# Altium footprint library DEMO板PCB封装.PcbLib: 34 footprints (part 2 of 3)
Each footprint in its own frame and in the unit in brackets; x right, y up, seen from the top. Pads: shape width x height; smd on the part's side, far side on the other; paste and mask are expansions set on the pad; w line width, h text height; cw(c..) or ccw(c..) is an arc to the next point about the centre after c.
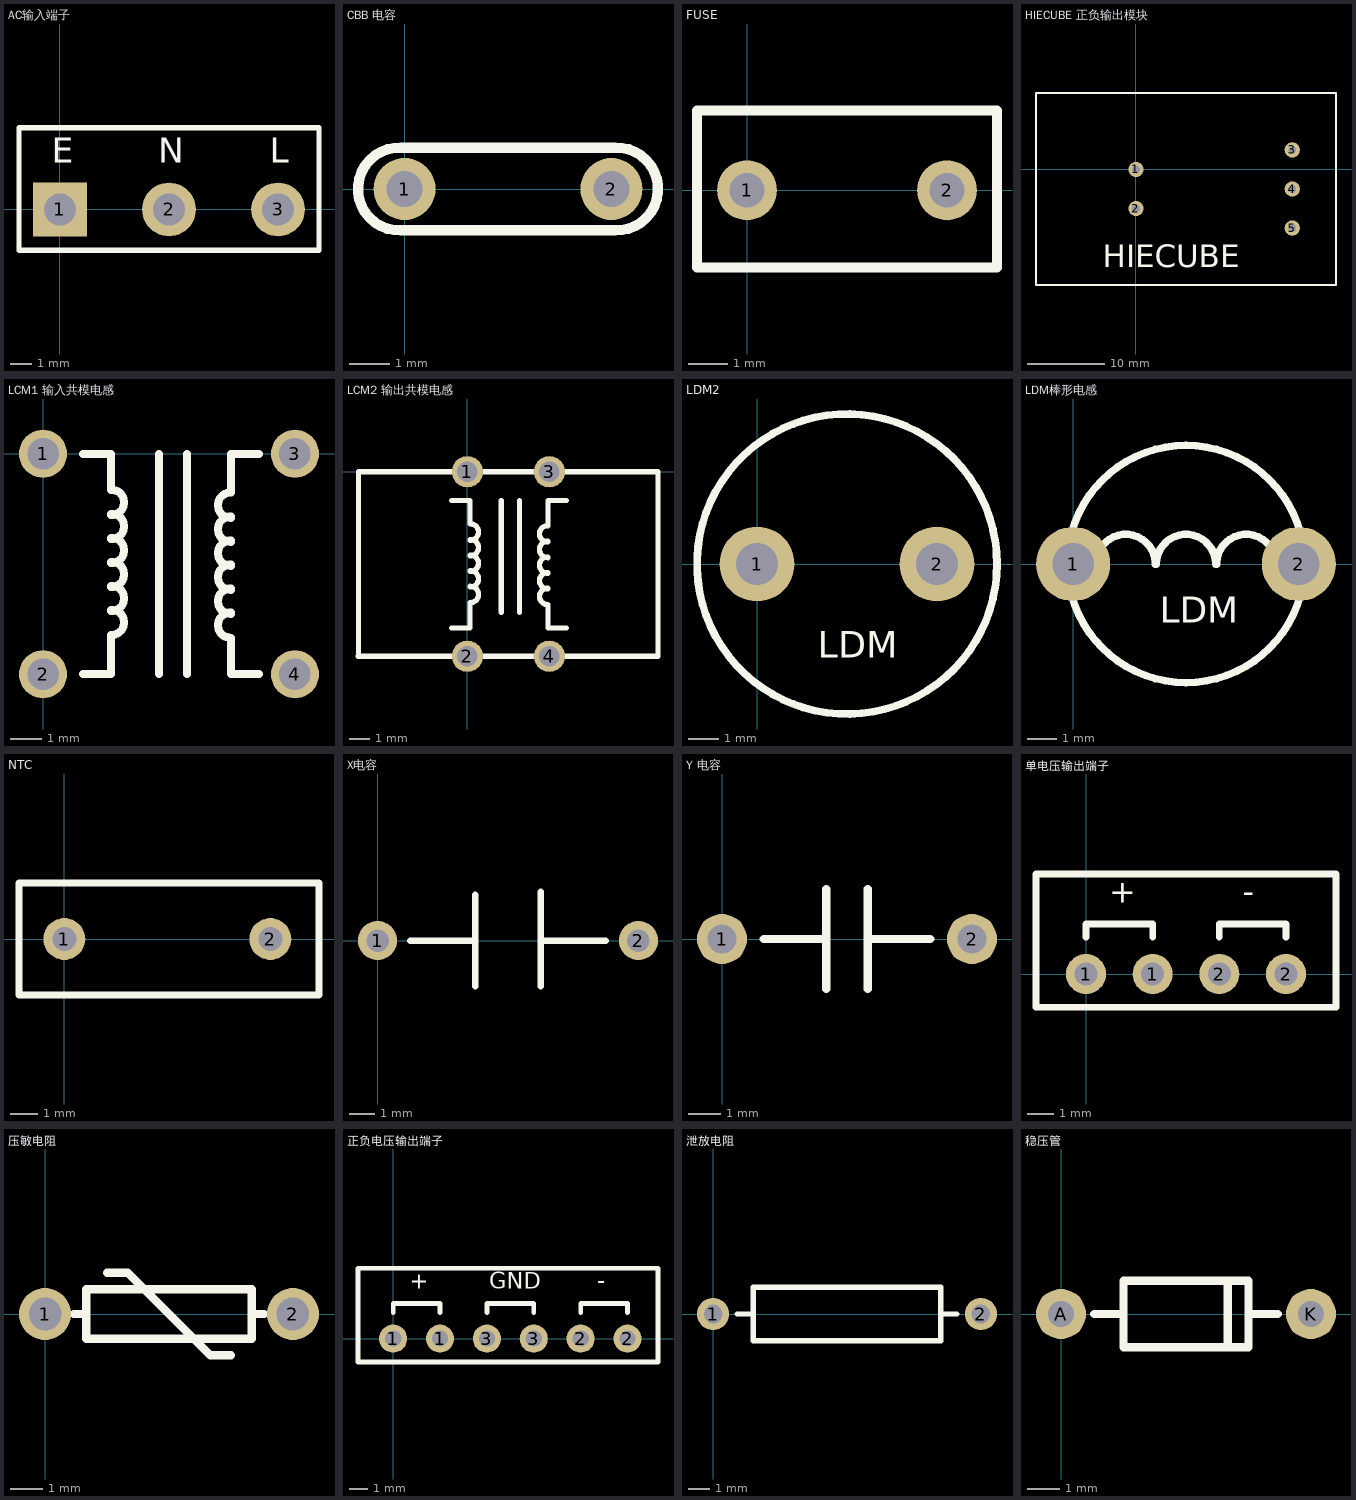
[diagram p1: the footprints below, top view; thin cyan lines are the x and y axes]

## AC输入端子 [mm]
pads (3):
  rect 2.5x2.5 hole 1.5: 1(0,0)
  round 2.5 hole 1.5: 2(5.08,0) 3(10.16,0)
Top Overlay:
  lines w0.254: -1.905,-1.905 12.065,-1.905 12.065,3.81 -1.905,3.81 -1.905,-1.905
  text "E" at -0.381,1.778 h2
  text "L" at 9.779,1.778 h2
  text "N" at 4.572,1.778 h2

## CBB 电容 [mil]
pads (2):
  round 60 hole 34.65: 1(0,0) 2(200,0)
Top Overlay:
  lines w10: -3.14,-40 203.04,-40 ; -3.14,-39.96 cw(c-5,0) -3.04,39.95 ; -3.04,40 203.14,40 ; 203.04,-39.95 ccw(c205,0) 203.14,39.96

## FUSE [mil]
pads (2):
  round 60 hole 34.65: 1(0,0) 2(200,0)
Top Overlay:
  lines w10: -50,-77.48 250,-77.48 250,80 -50,80 -50,-77.48

## HIECUBE 正负输出模块 [mm]
pads (5):
  round 2 hole 1: 1(0,0) 2(0,-5.08) 3(20.32,2.54) 4(20.32,-2.54) 5(20.32,-7.62)
Top Overlay:
  lines w0.254: -13,-15.04 26,-15.04 26,9.96 -13,9.96 -13,-15.04
  text "HIECUBE" at -4.318,-13.716 h5

## LCM1 输入共模电感 [mm]
pads (4):
  round 1.524 hole 1: 1(0,0) 2(0,-7) 3(8,0) 4(8,-7)
Top Overlay:
  lines w0.254: 1.27,-6.985 2.159,-6.985 2.159,-5.842 ; 1.27,0 2.159,0 2.159,-1.143 cw(c2.176,-1.543) 2.157,-1.942 ; 2.157,-5.752 ccw(c2.176,-5.353) 2.159,-4.953 ; 2.157,-4.99 ccw(c2.176,-4.591) 2.159,-4.191 ; 2.157,-4.228 ccw(c2.176,-3.829) 2.159,-3.429 ; 2.157,-3.466 ccw(c2.176,-3.067) 2.159,-2.667 ; 2.157,-2.704 ccw(c2.176,-2.305) 2.159,-1.905 ; 3.683,-6.985 3.683,0 ; 4.572,-6.985 4.572,0 ; 5.969,-5.08 cw(c5.952,-4.68) 5.971,-4.281 ; 5.969,-4.318 cw(c5.952,-3.918) 5.971,-3.519 ; 5.969,-3.556 cw(c5.952,-3.156) 5.971,-2.757 ; 5.969,-2.794 cw(c5.952,-2.394) 5.971,-1.995 ; 5.969,-2.032 cw(c5.952,-1.632) 5.971,-1.233 ; 5.969,-1.143 5.969,0 6.858,0 ; 5.971,-5.043 ccw(c5.952,-5.442) 5.969,-5.842 5.969,-6.985 6.858,-6.985

## LCM2 输出共模电感 [mm]
pads (4):
  round 1.524 hole 1: 1(0,0) 2(0,-9) 3(4,0) 4(4,-9)
Top Overlay:
  lines w0.254: -5.334,-9 9.3,-9 9.3,0 -5.3,0 ; -5.316,-9 -5.316,-0.127 ; -0.762,-7.62 0.127,-7.62 0.127,-6.477 ; -0.762,-1.397 0.127,-1.397 0.127,-2.54 cw(c0.144,-2.94) 0.125,-3.339 ; 0.125,-6.387 ccw(c0.144,-5.988) 0.127,-5.588 ; 0.125,-5.625 ccw(c0.144,-5.226) 0.127,-4.826 ; 0.125,-4.863 ccw(c0.144,-4.464) 0.127,-4.064 ; 0.125,-4.101 ccw(c0.144,-3.702) 0.127,-3.302 ; 1.651,-6.858 1.651,-1.397 ; 2.54,-6.858 2.54,-1.397 ; 3.937,-5.715 cw(c3.92,-5.315) 3.939,-4.916 ; 3.937,-4.953 cw(c3.92,-4.553) 3.939,-4.154 ; 3.937,-4.191 cw(c3.92,-3.791) 3.939,-3.392 ; 3.937,-3.429 cw(c3.92,-3.029) 3.939,-2.63 ; 3.937,-2.54 3.937,-1.397 4.826,-1.397 ; 3.939,-5.678 ccw(c3.92,-6.077) 3.937,-6.477 3.937,-7.62 4.826,-7.62

## LDM2 [mm]
pads (2):
  round 2.5 hole 1.4: 1(0,0) 2(6,0)
Top Overlay:
  circle w0.254: c3,0 r5
  text "LDM" at 2.032,-3.429 h1.52

## LDM棒形电感 [mm]
pads (2):
  round 2.5 hole 1.4: 1(0,0) 2(7.62,0)
Top Overlay:
  circle w0.254: c3.81,0 r4
  lines w0.254: 0.778,0 cw(c1.778,0) 2.778,0 ; 2.81,0 cw(c3.81,0) 4.81,0 ; 4.842,0 cw(c5.842,0) 6.842,0
  text "LDM" at 2.921,-2.286 h1.52

## NTC [mil]
pads (2):
  round 60 hole 34.65: 1(0,0) 2(295.28,0)
Top Overlay:
  lines w10: -65,-80 -65,80 365,80 365,-80 -65,-80

## X电容 [mil]
pads (2):
  round 60 hole 34.65: 1(0,0) 2(400,0)
Top Overlay:
  lines w10: 50,0 150,0 ; 150,-70 150,70 ; 250,-70 250,75 ; 250,0 350,0

## Y 电容 [mil]
pads (2):
  round 60 hole 34.65: 1(0,0) 2(300,0)
Top Overlay:
  lines w10: 50,0 125,0 ; 125,-60 125,60 ; 175,-60 175,60 ; 175,0 250,0

## 单电压输出端子 [mil]
pads (4):
  round 60 hole 34.65: 1(0,0) 1(100,0) 2(200,0) 2(300,0)
Top Overlay:
  lines w10: 0,55 0,75 100,75 100,55 ; 200,55 200,75 300,75 300,55 ; -75,-50 -75,150 375,150 375,-50 -75,-50
  text "+" at 35,95 h60
  text "-" at 235,95 h60

## 压敏电阻 [mm]
pads (2):
  round 1.6 hole 1: 1(0,0) 2(7.62,0)
Top Overlay:
  lines w0.254: 0.889,0 1.27,0 ; 1.905,1.27 2.54,1.27 5.08,-1.27 5.715,-1.27 ; 6.35,0 6.731,0 ; 1.27,-0.762 6.35,-0.762 6.35,0.762 1.27,0.762 1.27,-0.762

## 正负电压输出端子 [mil]
pads (6):
  round 60 hole 34.65: 1(0,0) 1(100,0) 2(400,0) 2(500,0) 3(200,0) 3(300,0)
Top Overlay:
  lines w10: 0,55 0,75 100,75 100,55 ; 200,55 200,75 300,75 300,55 ; 400,55 400,75 500,75 500,55 ; -75,-50 565,-50 565,150 -75,150 -75,-50
  text "GND" at 205,95 h60
  text "-" at 435,95 h60
  text "+" at 35,95 h60

## 泄放电阻 [mil]
pads (2):
  round 60 hole 34.65: 1(0,0) 2(500,0)
Top Overlay:
  lines w10: 45,0 75,0 ; 425,0 455,0 ; 75,-50 75,50 425,50 425,-50 75,-50

## 稳压管 [mil]
pads (2):
  round 60 hole 31.5: A(0,0) K(300,0)
Top Overlay:
  lines w10: 40,0 75,0 ; 200,-40 200,40 ; 225,0 260,0 ; 75,-40 225,-40 225,40 75,40 75,-40